# Altium footprint library SG_PCB_HOLE_Connector.PcbLib: 133 footprints (part 8 of 9)
Each footprint in its own frame and in the unit in brackets; x right, y up, seen from the top. Pads: shape width x height; smd on the part's side, far side on the other; paste and mask are expansions set on the pad; w line width, h text height; cw(c..) or ccw(c..) is an arc to the next point about the centre after c.
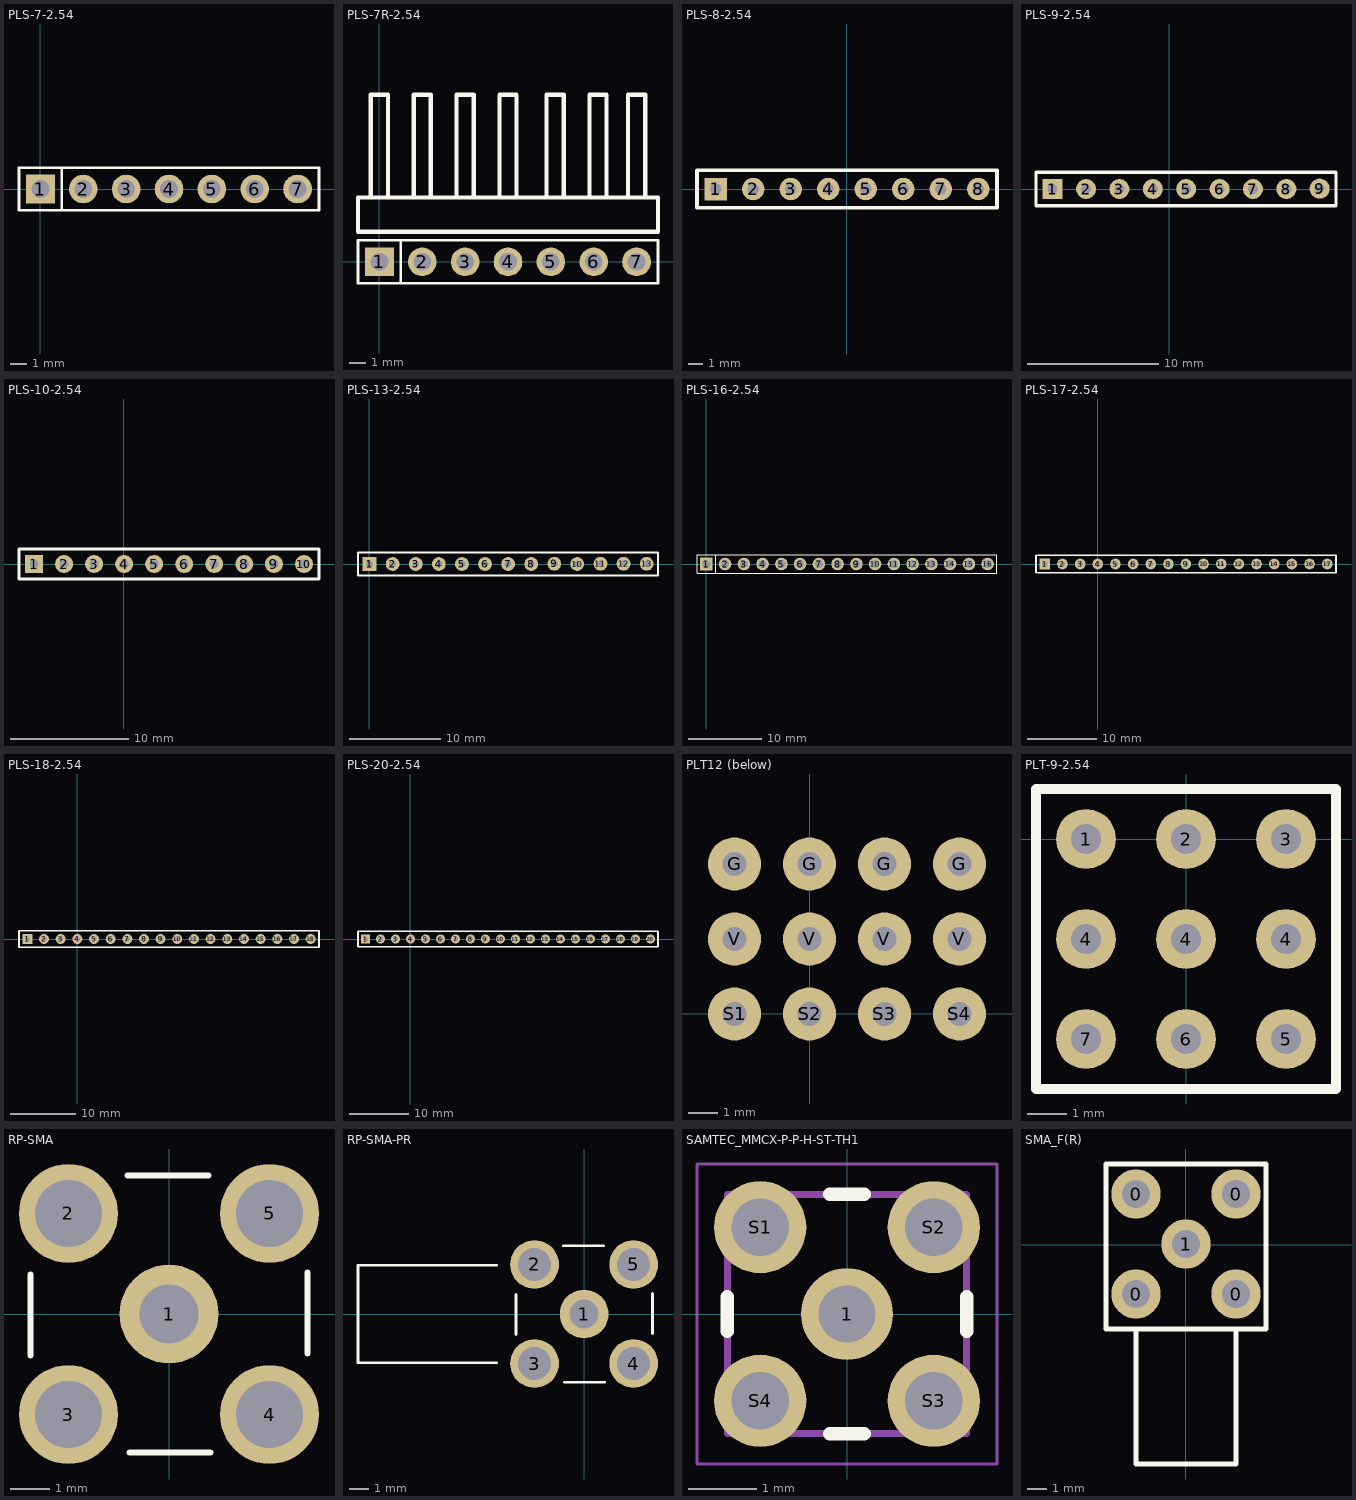
[diagram p7: the footprints below, top view; thin cyan lines are the x and y axes]

## PLS-7-2.54 [mm]
pads (7):
  rect 1.7x1.7 hole 1.05 mask+0.05: 1(0,0)
  round 1.7 hole 1.05 mask+0.05: 2(2.54,0) 3(5.08,0) 4(7.62,0) 5(10.16,0) 6(12.7,0) 7(15.24,0)
Top Overlay:
  lines w0.15: 1.27,-1.27 1.27,1.27 ; -1.27,-1.27 16.51,-1.27 16.51,1.27 -1.27,1.27 -1.27,-1.27
3D body "PLS1.stp": height 8.54, standoff -3, extent 13.97,-1.27 16.51,1.27
3D body "PLS1.stp": height 8.54, standoff -3, extent 11.43,-1.27 13.97,1.27
3D body "PLS1.stp": height 8.54, standoff -3, extent 8.89,-1.27 11.43,1.27
3D body "PLS1.stp": height 8.54, standoff -3, extent 6.35,-1.27 8.89,1.27
3D body "PLS1.stp": height 8.54, standoff -3, extent 3.81,-1.27 6.35,1.27
3D body "PLS1.stp": height 8.54, standoff -3, extent 1.27,-1.27 3.81,1.27
3D body "PLS1.stp": height 8.54, standoff -3, extent -1.27,-1.27 1.27,1.27

## PLS-7R-2.54 [mm]
pads (7):
  rect 1.7x1.7 hole 1.05 mask+0.05: 1(0,0)
  round 1.7 hole 1.05 mask+0.05: 2(2.54,0) 3(5.08,0) 4(7.62,0) 5(10.16,0) 6(12.7,0) 7(15.24,0)
Top Overlay:
  lines w0.15: 1.27,-1.27 1.27,1.27 ; -1.27,-1.27 -1.27,1.27 16.51,1.27 16.51,-1.27 -1.27,-1.27
  lines w0.254: -0.508,3.81 -0.508,9.906 0.508,9.906 0.508,3.81 ; 2.032,3.81 2.032,9.906 3.048,9.906 3.048,3.81 ; 4.572,3.81 4.572,9.906 5.588,9.906 5.588,3.81 ; 7.112,3.81 7.112,9.906 8.128,9.906 8.128,3.81 ; 9.906,3.81 9.906,9.906 10.922,9.906 10.922,3.81 ; 12.446,3.81 12.446,9.906 13.462,9.906 13.462,3.81 ; 14.732,3.81 14.732,9.906 15.748,9.906 15.748,3.81 ; -1.27,1.778 16.51,1.778 16.51,3.81 -1.27,3.81 -1.27,1.778
3D body "PLS-1R_D1.STEP": height 3, standoff -2.5, extent 13.97,-0.32 16.51,10.04
3D body "PLS-1R_D1.STEP": height 3, standoff -2.5, extent 11.43,-0.32 13.97,10.04
3D body "PLS-1R_D1.STEP": height 3, standoff -2.5, extent 8.89,-0.32 11.43,10.04
3D body "PLS-1R_D1.STEP": height 3, standoff -2.5, extent 6.35,-0.32 8.89,10.04
3D body "PLS-1R_D1.STEP": height 3, standoff -2.5, extent 3.81,-0.32 6.35,10.04
3D body "PLS-1R_D1.STEP": height 3, standoff -2.5, extent 1.27,-0.32 3.81,10.04
3D body "PLS-1R_D1.STEP": height 3, standoff -2.5, extent -1.27,-0.354 1.27,10.006

## PLS-8-2.54 [mil]
pads (8):
  rect 60x60 hole 30: 1(-348.82,0)
  round 60 hole 30: 2(-248.82,0) 3(-148.82,0) 4(-48.82,0) 5(51.18,0) 6(151.18,0) 7(251.18,0) 8(351.18,0)
Top Overlay:
  lines w10: -3.15,-50 396.85,-50 ; -3.15,50 396.85,50 ; 1.18,-50 -398.82,-50 -398.82,50 1.18,50 ; 401.18,-50 401.18,50
3D body "PLS1.stp": height 336.22, standoff -118.11, extent -398.82,-50 -298.82,50
3D body "PLS1.stp": height 336.22, standoff -118.11, extent -298.82,-50 -198.82,50
3D body "PLS1.stp": height 336.22, standoff -118.11, extent -198.82,-50 -98.82,50
3D body "PLS1.stp": height 336.22, standoff -118.11, extent -98.82,-50 1.18,50
3D body "PLS1.stp": height 336.22, standoff -118.11, extent 1.18,-50 101.18,50
3D body "PLS1.stp": height 336.22, standoff -118.11, extent 101.18,-50 201.18,50
3D body "PLS1.stp": height 336.22, standoff -118.11, extent 201.18,-50 301.18,50
3D body "PLS1.stp": height 336.22, standoff -118.11, extent 301.18,-50 401.18,50

## PLS-9-2.54 [mil]
pads (9):
  rect 60x60 hole 30: 1(-348.82,0)
  round 60 hole 30: 2(-248.82,0) 3(-148.82,0) 4(-48.82,0) 5(51.18,0) 6(151.18,0) 7(251.18,0) 8(351.18,0) 9(451,1)
Top Overlay:
  lines w10: -3.15,-50 500,-50 500,50 400,50 -3.15,50 ; 1.18,-50 -398.82,-50 -398.82,50 1.18,50
3D body "PLS1.stp": height 336.22, standoff -118.11, extent 401,-49 501,51
3D body "PLS1.stp": height 336.22, standoff -118.11, extent -398.82,-50 -298.82,50
3D body "PLS1.stp": height 336.22, standoff -118.11, extent -298.82,-50 -198.82,50
3D body "PLS1.stp": height 336.22, standoff -118.11, extent -198.82,-50 -98.82,50
3D body "PLS1.stp": height 336.22, standoff -118.11, extent -98.82,-50 1.18,50
3D body "PLS1.stp": height 336.22, standoff -118.11, extent 1.18,-50 101.18,50
3D body "PLS1.stp": height 336.22, standoff -118.11, extent 101.18,-50 201.18,50
3D body "PLS1.stp": height 336.22, standoff -118.11, extent 201.18,-50 301.18,50
3D body "PLS1.stp": height 336.22, standoff -118.11, extent 301.18,-50 401.18,50

## PLS-10-2.54 [mil]
pads (10):
  rect 60x60 hole 30: 1(-298.82,0)
  round 60 hole 30: 2(-198.82,0) 3(-98.82,0) 4(1.18,0) 5(101.18,0) 6(201.18,0) 7(301.18,0) 8(401.18,0) 9(500,0) 10(600,0)
Top Overlay:
  lines w10: 46.85,-50 650,-50 650,50 46.85,50 ; 51.18,-50 -348.82,-50 -348.82,50 51.18,50
3D body "PLS1.stp": height 336.22, standoff -118.11, extent 550,-50 650,50
3D body "PLS1.stp": height 336.22, standoff -118.11, extent 450,-50 550,50
3D body "PLS1.stp": height 336.22, standoff -118.11, extent 351.18,-50 451.18,50
3D body "PLS1.stp": height 336.22, standoff -118.11, extent 251.18,-50 351.18,50
3D body "PLS1.stp": height 336.22, standoff -118.11, extent 151.18,-50 251.18,50
3D body "PLS1.stp": height 336.22, standoff -118.11, extent 51.18,-50 151.18,50
3D body "PLS1.stp": height 336.22, standoff -118.11, extent -48.82,-50 51.18,50
3D body "PLS1.stp": height 336.22, standoff -118.11, extent -148.82,-50 -48.82,50
3D body "PLS1.stp": height 336.22, standoff -118.11, extent -248.82,-50 -148.82,50
3D body "PLS1.stp": height 336.22, standoff -118.11, extent -348.82,-50 -248.82,50

## PLS-13-2.54 [mil]
pads (13):
  rect 60x60 hole 30: 1(1.18,0)
  round 60 hole 30: 2(101.18,0) 3(201.18,0) 4(301.18,0) 5(401.18,0) 6(501.18,0) 7(601.18,0) 8(701.18,0) 9(801,1) 10(900,0) 11(1001,1) 12(1101,1) 13(1201,1)
Top Overlay:
  lines w10: 346.85,-50 1250,-50 1250,50 750,50 346.85,50 ; 351.18,-50 -48.82,-50 -48.82,50 351.18,50
3D body "PLS1.stp": height 336.22, standoff -118.11, extent 751,-49 851,51
3D body "PLS1.stp": height 336.22, standoff -118.11, extent 1151,-49 1251,51
3D body "PLS1.stp": height 336.22, standoff -118.11, extent 1051,-49 1151,51
3D body "PLS1.stp": height 336.22, standoff -118.11, extent 951,-49 1051,51
3D body "PLS1.stp": height 336.22, standoff -118.11, extent 851,-49 951,51
3D body "PLS1.stp": height 336.22, standoff -118.11, extent 651.18,-50 751.18,50
3D body "PLS1.stp": height 336.22, standoff -118.11, extent 551.18,-50 651.18,50
3D body "PLS1.stp": height 336.22, standoff -118.11, extent 451.18,-50 551.18,50
3D body "PLS1.stp": height 336.22, standoff -118.11, extent 351.18,-50 451.18,50
3D body "PLS1.stp": height 336.22, standoff -118.11, extent 251.18,-50 351.18,50
3D body "PLS1.stp": height 336.22, standoff -118.11, extent 151.18,-50 251.18,50
3D body "PLS1.stp": height 336.22, standoff -118.11, extent 51.18,-50 151.18,50
3D body "PLS1.stp": height 336.22, standoff -118.11, extent -48.82,-50 51.18,50

## PLS-16-2.54 [mm]
pads (16):
  rect 1.7x1.7 hole 1.05 mask+0.05: 1(0,0)
  round 1.7 hole 1.05 mask+0.05: 2(2.54,0) 3(5.08,0) 4(7.62,0) 5(10.16,0) 6(12.7,0) 7(15.24,0) 8(17.78,0) 9(20.32,0) 10(22.86,0) 11(25.4,0) 12(27.94,0) 13(30.48,0) 14(33.02,0) 15(35.56,0) 16(38.1,0)
Top Overlay:
  lines w0.15: 1.27,-1.27 1.27,1.27 ; -1.27,-1.27 -1.27,1.27 39.37,1.27 39.37,-1.27 -1.27,-1.27
3D body "PLS.STEP": height 8.44, standoff -3, extent 36.83,-1.27 39.37,1.27
3D body "PLS.STEP": height 8.44, standoff -3, extent 34.29,-1.27 36.83,1.27
3D body "PLS.STEP": height 8.44, standoff -3, extent 31.75,-1.27 34.29,1.27
3D body "PLS.STEP": height 8.44, standoff -3, extent 29.21,-1.27 31.75,1.27
3D body "PLS.STEP": height 8.44, standoff -3, extent 26.67,-1.27 29.21,1.27
3D body "PLS.STEP": height 8.44, standoff -3, extent 24.13,-1.27 26.67,1.27
3D body "PLS.STEP": height 8.44, standoff -3, extent 21.59,-1.27 24.13,1.27
3D body "PLS.STEP": height 8.44, standoff -3, extent 19.05,-1.27 21.59,1.27
3D body "PLS.STEP": height 8.44, standoff -3, extent 16.51,-1.27 19.05,1.27
3D body "PLS.STEP": height 8.44, standoff -3, extent 13.97,-1.27 16.51,1.27
3D body "PLS.STEP": height 8.44, standoff -3, extent 11.43,-1.27 13.97,1.27
3D body "PLS.STEP": height 8.44, standoff -3, extent 8.89,-1.27 11.43,1.27
3D body "PLS.STEP": height 8.44, standoff -3, extent 6.35,-1.27 8.89,1.27
3D body "PLS.STEP": height 8.44, standoff -3, extent 1.27,-1.27 3.81,1.27
3D body "PLS.STEP": height 8.44, standoff -3, extent -1.27,-1.27 1.27,1.27
3D body "PLS.STEP": height 8.44, standoff -3, extent 3.81,-1.27 6.35,1.27

## PLS-17-2.54 [mil]
pads (17):
  rect 60x60 hole 30: 1(-298.82,0)
  round 60 hole 30: 2(-198.82,0) 3(-98.82,0) 4(1.18,0) 5(101.18,0) 6(201.18,0) 7(301.18,0) 8(401.18,0) 9(500,0) 10(600,0) 11(700,0) 12(800,0) 13(900,0) 14(1000,0) 15(1100,0) 16(1200,0) 17(1300,0)
Top Overlay:
  lines w10: 46.85,-50 1350,-50 1350,50 46.85,50 ; 51.18,-50 -348.82,-50 -348.82,50 51.18,50
3D body "PLS1.stp": height 336.22, standoff -118.11, extent 950,-50 1050,50
3D body "PLS1.stp": height 336.22, standoff -118.11, extent 850,-50 950,50
3D body "PLS1.stp": height 336.22, standoff -118.11, extent 750,-50 850,50
3D body "PLS1.stp": height 336.22, standoff -118.11, extent 650,-50 750,50
3D body "PLS1.stp": height 336.22, standoff -118.11, extent -348.82,-50 -248.82,50
3D body "PLS1.stp": height 336.22, standoff -118.11, extent -248.82,-50 -148.82,50
3D body "PLS1.stp": height 336.22, standoff -118.11, extent -148.82,-50 -48.82,50
3D body "PLS1.stp": height 336.22, standoff -118.11, extent -48.82,-50 51.18,50
3D body "PLS1.stp": height 336.22, standoff -118.11, extent 51.18,-50 151.18,50
3D body "PLS1.stp": height 336.22, standoff -118.11, extent 151.18,-50 251.18,50
3D body "PLS1.stp": height 336.22, standoff -118.11, extent 251.18,-50 351.18,50
3D body "PLS1.stp": height 336.22, standoff -118.11, extent 351.18,-50 451.18,50
3D body "PLS1.stp": height 336.22, standoff -118.11, extent 450,-50 550,50
3D body "PLS1.stp": height 336.22, standoff -118.11, extent 550,-50 650,50
3D body "PLS1.stp": height 336.22, standoff -118.11, extent 1250,-50 1350,50
3D body "PLS1.stp": height 336.22, standoff -118.11, extent 1150,-50 1250,50
3D body "PLS1.stp": height 336.22, standoff -118.11, extent 1050,-50 1150,50

## PLS-18-2.54 [mil]
pads (18):
  rect 60x60 hole 30: 1(-298.82,0)
  round 60 hole 30: 2(-198.82,0) 3(-98.82,0) 4(1.18,0) 5(101.18,0) 6(201.18,0) 7(301.18,0) 8(401.18,0) 9(500,0) 10(600,0) 11(700,0) 12(800,0) 13(900,0) 14(1000,0) 15(1100,0) 16(1200,0) 17(1300,0) 18(1400,0)
Top Overlay:
  lines w10: 46.85,-50 1450,-50 1450,50 46.85,50 ; 51.18,-50 -348.82,-50 -348.82,50 51.18,50
3D body "PLS1.stp": height 336.22, standoff -118.11, extent 1350,-50 1450,50
3D body "PLS1.stp": height 336.22, standoff -118.11, extent 550,-50 650,50
3D body "PLS1.stp": height 336.22, standoff -118.11, extent 450,-50 550,50
3D body "PLS1.stp": height 336.22, standoff -118.11, extent 351.18,-50 451.18,50
3D body "PLS1.stp": height 336.22, standoff -118.11, extent 251.18,-50 351.18,50
3D body "PLS1.stp": height 336.22, standoff -118.11, extent 151.18,-50 251.18,50
3D body "PLS1.stp": height 336.22, standoff -118.11, extent 51.18,-50 151.18,50
3D body "PLS1.stp": height 336.22, standoff -118.11, extent -48.82,-50 51.18,50
3D body "PLS1.stp": height 336.22, standoff -118.11, extent -148.82,-50 -48.82,50
3D body "PLS1.stp": height 336.22, standoff -118.11, extent -248.82,-50 -148.82,50
3D body "PLS1.stp": height 336.22, standoff -118.11, extent -348.82,-50 -248.82,50
3D body "PLS1.stp": height 336.22, standoff -118.11, extent 650,-50 750,50
3D body "PLS1.stp": height 336.22, standoff -118.11, extent 750,-50 850,50
3D body "PLS1.stp": height 336.22, standoff -118.11, extent 850,-50 950,50
3D body "PLS1.stp": height 336.22, standoff -118.11, extent 950,-50 1050,50
3D body "PLS1.stp": height 336.22, standoff -118.11, extent 1050,-50 1150,50
3D body "PLS1.stp": height 336.22, standoff -118.11, extent 1150,-50 1250,50
3D body "PLS1.stp": height 336.22, standoff -118.11, extent 1250,-50 1350,50

## PLS-20-2.54 [mil]
pads (20):
  rect 60x60 hole 30: 1(-298.82,0)
  round 60 hole 30: 2(-198.82,0) 3(-98.82,0) 4(1.18,0) 5(101.18,0) 6(201.18,0) 7(301.18,0) 8(401.18,0) 9(500,0) 10(600,0) 11(700,0) 12(800,0) 13(900,0) 14(1000,0) 15(1100,0) 16(1200,0) 17(1300,0) 18(1400,0) 19(1500,0) 20(1600,0)
Top Overlay:
  lines w10: 46.85,-50 1650,-50 1650,50 46.85,50 ; 51.18,-50 -348.82,-50 -348.82,50 51.18,50
3D body "PLS1.stp": height 336.22, standoff -118.11, extent 1550,-50 1650,50
3D body "PLS1.stp": height 336.22, standoff -118.11, extent 1450,-50 1550,50
3D body "PLS1.stp": height 336.22, standoff -118.11, extent 1250,-50 1350,50
3D body "PLS1.stp": height 336.22, standoff -118.11, extent 1150,-50 1250,50
3D body "PLS1.stp": height 336.22, standoff -118.11, extent 1050,-50 1150,50
3D body "PLS1.stp": height 336.22, standoff -118.11, extent 950,-50 1050,50
3D body "PLS1.stp": height 336.22, standoff -118.11, extent 850,-50 950,50
3D body "PLS1.stp": height 336.22, standoff -118.11, extent 750,-50 850,50
3D body "PLS1.stp": height 336.22, standoff -118.11, extent 650,-50 750,50
3D body "PLS1.stp": height 336.22, standoff -118.11, extent -348.82,-50 -248.82,50
3D body "PLS1.stp": height 336.22, standoff -118.11, extent -248.82,-50 -148.82,50
3D body "PLS1.stp": height 336.22, standoff -118.11, extent -148.82,-50 -48.82,50
3D body "PLS1.stp": height 336.22, standoff -118.11, extent -48.82,-50 51.18,50
3D body "PLS1.stp": height 336.22, standoff -118.11, extent 51.18,-50 151.18,50
3D body "PLS1.stp": height 336.22, standoff -118.11, extent 151.18,-50 251.18,50
3D body "PLS1.stp": height 336.22, standoff -118.11, extent 251.18,-50 351.18,50
3D body "PLS1.stp": height 336.22, standoff -118.11, extent 351.18,-50 451.18,50
3D body "PLS1.stp": height 336.22, standoff -118.11, extent 450,-50 550,50
3D body "PLS1.stp": height 336.22, standoff -118.11, extent 550,-50 650,50
3D body "PLS1.stp": height 336.22, standoff -118.11, extent 1350,-50 1450,50

## PLT12 (below) [mm]
pads (12):
  round 1.8 hole 0.8: G(-2.54,5.08) G(0,5.08) G(2.54,5.08) G(5.08,5.08) S1(-2.54,0) S2(0,0) S3(2.54,0) S4(5.08,0) V(-2.54,2.54) V(0,2.54) V(2.54,2.54) V(5.08,2.54)
Bottom Overlay:
  lines w0.254: -3.81,-1.27 6.35,-1.27 6.35,6.35 -3.81,6.35 -3.81,-1.27
3D body "PLS1.stp": height 2.5, standoff -9.04, extent -3.81,3.81 -1.27,6.35
3D body "PLS1.stp": height 2.5, standoff -9.04, extent -1.27,3.81 1.27,6.35
3D body "PLS1.stp": height 2.5, standoff -9.04, extent 1.27,3.81 3.81,6.35
3D body "PLS1.stp": height 2.5, standoff -9.04, extent 3.81,3.81 6.35,6.35
3D body "PLS1.stp": height 2.5, standoff -9.04, extent -3.81,1.27 -1.27,3.81
3D body "PLS1.stp": height 2.5, standoff -9.04, extent -1.27,1.27 1.27,3.81
3D body "PLS1.stp": height 2.5, standoff -9.04, extent 1.27,1.27 3.81,3.81
3D body "PLS1.stp": height 2.5, standoff -9.04, extent 3.81,1.27 6.35,3.81
3D body "PLS1.stp": height 2.5, standoff -9.04, extent 3.81,-1.27 6.35,1.27
3D body "PLS1.stp": height 2.5, standoff -9.04, extent 1.27,-1.27 3.81,1.27
3D body "PLS1.stp": height 2.5, standoff -9.04, extent -1.27,-1.27 1.27,1.27
3D body "PLS1.stp": height 2.5, standoff -9.04, extent -3.81,-1.27 -1.27,1.27

## PLT-9-2.54 [mil]
pads (9):
  round 60 hole 30: 1(-100,0) 2(0,0) 3(100,0) 4(-100,-100) 4(0,-100) 4(100,-100) 5(100,-200) 6(0,-200) 7(-100,-200)
Top Overlay:
  lines w10: -150,-250 150,-250 150,50 -150,50 -150,-250
3D body "PLS1.stp": height 336.22, standoff -118.11, extent 50,-250 150,-150
3D body "PLS1.stp": height 336.22, standoff -118.11, extent -50,-250 50,-150
3D body "PLS1.stp": height 336.22, standoff -118.11, extent -150,-250 -50,-150
3D body "PLS1.stp": height 336.22, standoff -118.11, extent -150,-150 -50,-50
3D body "PLS1.stp": height 336.22, standoff -118.11, extent -50,-150 50,-50
3D body "PLS1.stp": height 336.22, standoff -118.11, extent 50,-150 150,-50
3D body "PLS1.stp": height 336.22, standoff -118.11, extent 50,-50 150,50
3D body "PLS1.stp": height 336.22, standoff -118.11, extent -50,-50 50,50
3D body "PLS1.stp": height 336.22, standoff -118.11, extent -150,-50 -50,50

## RP-SMA [mm]
pads (5):
  round 2.5 hole 1.5 mask+0.05: 1(0,0)
  round 2.5 hole 1.7 mask+0.05: 2(-2.54,2.54) 3(-2.54,-2.54) 4(2.54,-2.54) 5(2.54,2.54)
Top Overlay:
  lines w0.15: -3.5,-1.05 -3.5,0 -3.5,1 ; -1.05,3.5 0,3.5 1,3.5 ; -1,-3.5 0,-3.5 1.05,-3.5 ; 3.5,-1 3.5,0 3.5,1.05

## RP-SMA-PR [mm]
pads (5):
  round 2.5 hole 1.5 mask+0.05: 1(0,0)
  round 2.5 hole 1.7 mask+0.05: 2(-2.54,2.54) 3(-2.54,-2.54) 4(2.54,-2.54) 5(2.54,2.54)
Top Overlay:
  lines w0.15: -4.5,-2.5 -11.6,-2.5 -11.6,2.5 -4.5,2.5 ; -3.5,-1.05 -3.5,0 -3.5,1 ; -1.05,3.5 0,3.5 1,3.5 ; -1,-3.5 0,-3.5 1.05,-3.5 ; 3.5,-1 3.5,0 3.5,1.05
3D body: height 9.77, standoff 3.42, extent -11.45,-3.172 -3,3.172
3D body: height 9.6, standoff 0, extent -3,-3 3,3

## SAMTEC_MMCX-P-P-H-ST-TH1 [mm]
pads (5):
  round 1.348 hole 0.84: 1(0,0) S1(-1.27,1.27) S2(1.27,1.27) S3(1.27,-1.27) S4(-1.27,-1.27)
Top Overlay:
  lines w0.2: -1.75,-0.25 -1.75,0.25 ; -0.25,-1.75 0.25,-1.75 ; -0.25,1.75 0.25,1.75 ; 1.75,-0.25 1.75,0.25
Top Assembly:
  lines w0.1: -1.75,-1.75 -1.75,1.75 1.75,1.75 1.75,-1.75 -1.75,-1.75
Top Courtyard:
  lines w0.05: -2.195,-2.195 2.195,-2.195 2.195,2.195 -2.195,2.195 -2.195,-2.195
3D body "MMCX-P-P-H-ST-TH1.stp": height 5.35, standoff -2.05, extent -1.75,-1.75 1.75,1.75

## SMA_F(R) [mm]
pads (5):
  round 2.5 hole 1.4: 0(-2.515,-2.49) 0(-2.515,2.59) 0(2.565,-2.49) 0(2.565,2.59) 1(0.025,0.05)
Top Overlay:
  lines w0.254: -2.515,-4.268 -2.515,-11.126 2.565,-11.126 2.565,-4.268 ; -4.039,-4.268 4.089,-4.268 4.089,-3.76 4.089,4.114 -4.039,4.114 -4.039,-4.268
3D body "SMA-F (R).step": height 11.86, standoff -2.24, extent -3.419,-11.31 3.581,3.79